# Altium footprint library myPcbLib.PcbLib: 987 footprints (part 52 of 62)
Each footprint in its own frame and in the unit in brackets; x right, y up, seen from the top. Pads: shape width x height; smd on the part's side, far side on the other; paste and mask are expansions set on the pad; w line width, h text height; cw(c..) or ccw(c..) is an arc to the next point about the centre after c.
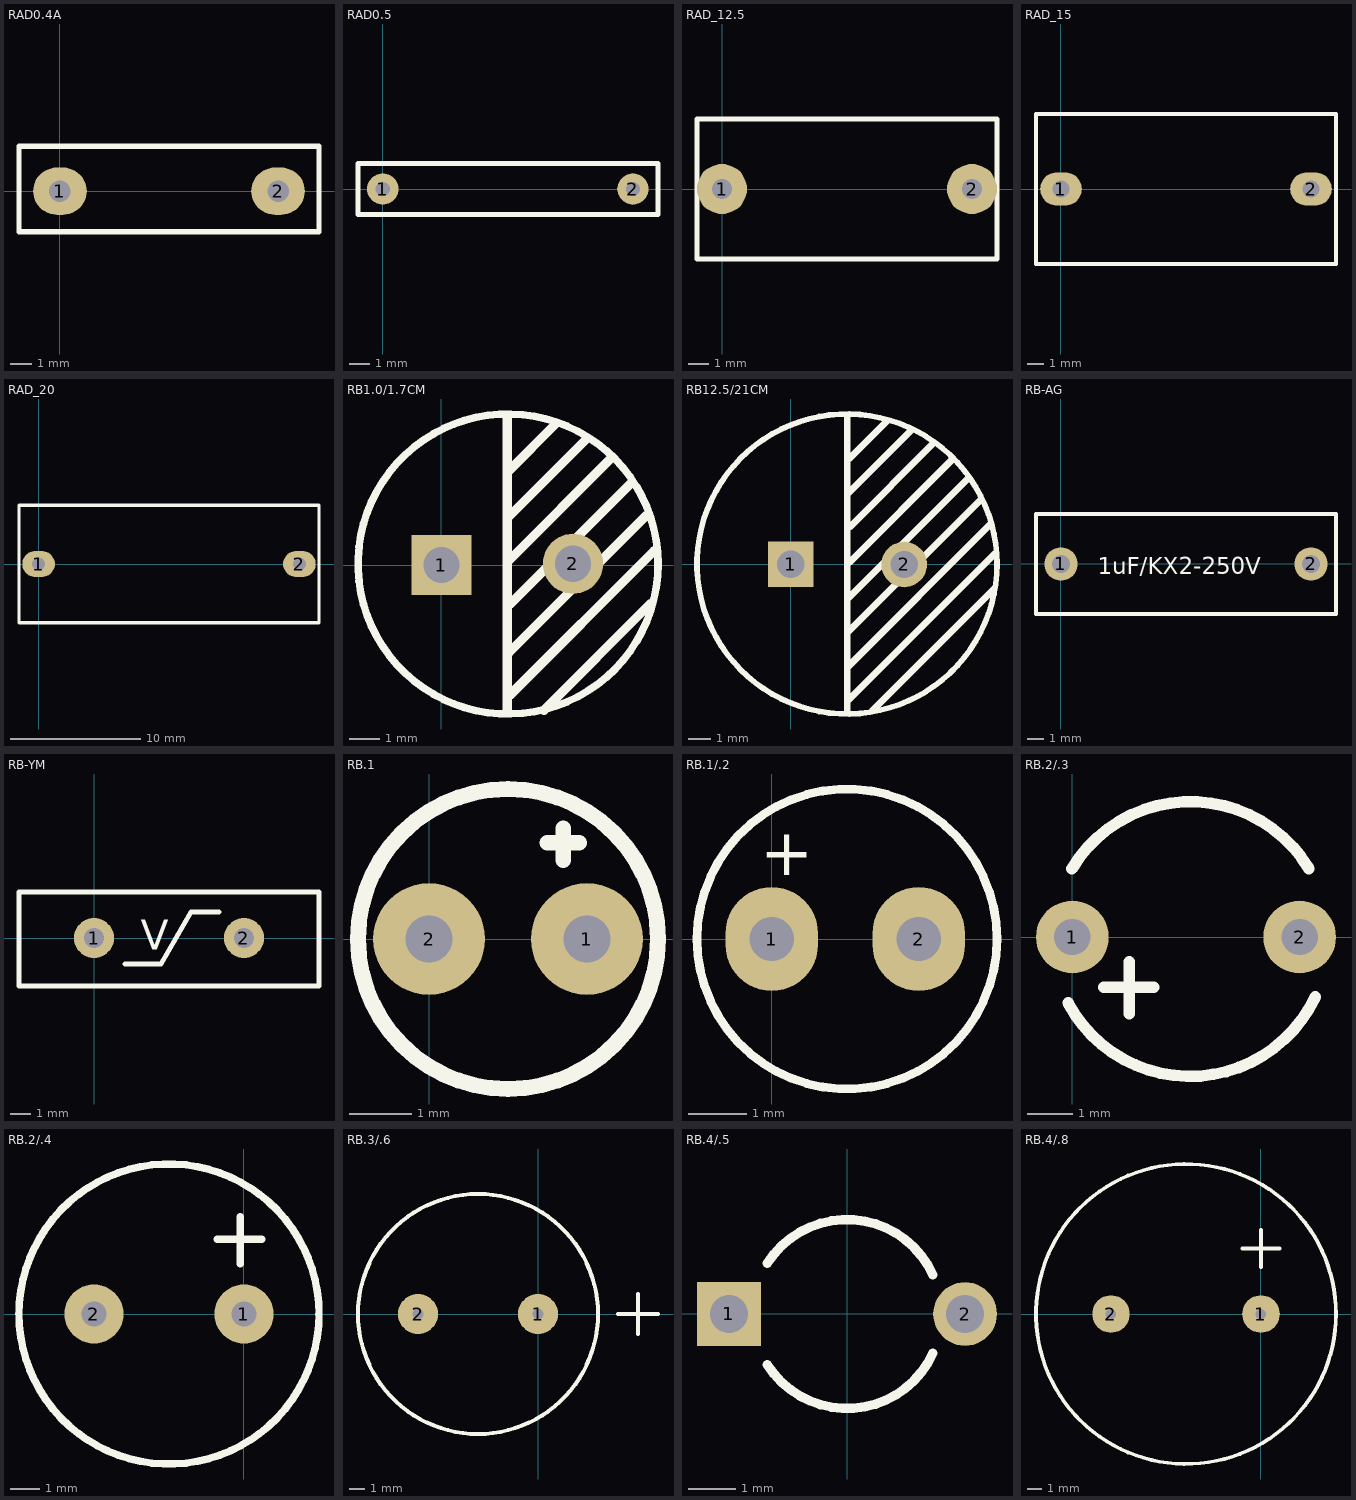
[diagram p51: the footprints below, top view; thin cyan lines are the x and y axes]

## RAD0.4A [mm]
pads (2):
  oval 2.5x2.2 hole 1: 1(0,0) 2(10.16,0)
Top Overlay:
  lines w0.254: -1.905,-1.9 12.065,-1.9 12.065,2.1 -1.905,2.1 -1.905,-1.9

## RAD0.5 [mil]
pads (2):
  round 62 hole 28: 1(0,0) 2(492.13,0)
Top Overlay:
  lines w10: -48.82,-50 541.34,-50 541.34,50 -48.82,50 -48.82,-50

## RAD_12.5 [mm]
pads (2):
  round 2.5 hole 1: 1(0,0) 2(12.5,0)
Top Overlay:
  lines w0.254: -1.25,-3.5 -1.25,3.5 13.75,3.5 13.75,-3.5 -1.25,-3.5

## RAD_15 [mm]
pads (2):
  oval 2.5x2 hole 1: 1(0,0) 2(15,0)
Top Overlay:
  lines w0.254: -1.5,-4.5 16.5,-4.5 16.5,4.5 -1.5,4.5 -1.5,-4.5

## RAD_20 [mm]
pads (2):
  oval 2.5x2 hole 1: 1(0,0) 2(20,0)
Top Overlay:
  lines w0.254: -1.5,-4.5 -1.5,4.5 21.5,4.5 21.5,-4.5 -1.5,-4.5

## RB1.0/1.7CM [mm]
pads (2):
  rect 2x2 hole 1.2: 1(0,0)
  round 2 hole 1.2: 2(4.365,0.04)
Top Overlay:
  circle w0.25: c2.208,0.034 r4.978
  lines w0.305: 2.184,-4.881 2.184,4.972 ; 2.195,1.564 4.841,4.21 ; 2.195,3.088 3.825,4.718 ; 2.216,-2.934 6.788,1.638 ; 2.227,0.146 5.666,3.586 ; 2.258,-4.331 7.063,0.474 ; 2.258,-1.314 6.291,2.718 ; 3.401,-4.818 6.947,-1.272

## RB12.5/21CM [mm]
pads (2):
  rect 2x2 hole 1.2: 1(0,0)
  round 2 hole 1.2: 2(4.974,-0.011)
Top Overlay:
  circle w0.25: c2.466,0.011 r6.579
  lines w0.305: 2.476,-6.519 2.476,6.53 ; 2.498,-4.498 8.731,1.736 ; 2.529,-1.482 7.768,3.757 ; 2.54,-2.953 8.34,2.847 ; 2.551,3.154 5.271,5.874 ; 2.561,-5.937 8.943,0.445 ; 2.572,4.635 4.223,6.286 ; 2.593,0.106 7.048,4.561 ; 2.614,1.662 6.244,5.292 ; 3.588,-6.413 8.922,-1.079

## RB-AG [mm]
pads (2):
  round 2 hole 1.1: 1(0,0) 2(15,0)
Top Overlay:
  lines w0.254: -1.5,-3 -1.5,3 16.5,3 16.5,-3 -1.5,-3
  text "1uF/KX2-250V" at 2.2,-0.6 h1

## RB-YM [mm]
pads (2):
  round 2 hole 1: 1(0,0) 2(7.5,0)
Top Overlay:
  lines w0.254: 1.55,-1.3 3.35,-1.3 4.85,1.3 6.25,1.3 ; -3.75,-2.4 11.25,-2.4 11.25,2.3 -3.75,2.3 -3.75,-2.4
  text "V" at 2.35,-0.6 h1.5

## RB.1 [mm]
pads (2):
  round 1.8 hole 0.762: 1(2.54,0) 2(0,0)
Top Overlay:
  circle w0.254: c1.27,0 r2.413
  lines w0.254: 1.905,1.549 2.413,1.549 ; 2.159,1.27 2.159,1.778

## RB.1/.2 [mm]
pads (2):
  oval 1.6x1.8 hole 0.762: 1(0,0) 2(2.54,0)
Top Overlay:
  circle w0.15: c1.3,0 r2.593
  text "+" at -0.2,1.1 h0.8

## RB.2/.3 [mm]
pads (2):
  round 1.6 hole 0.8: 1(0,0) 2(5,0)
Top Overlay:
  lines w0.254: -0.095,-1.45 ccw(c2.591,-0.025) 5.342,-1.32 ; -0.009,1.505 cw(c2.597,-0.062) 5.204,1.502 ; 0.695,-1.1 1.787,-1.1 ; 1.254,-1.684 1.254,-0.541

## RB.2/.4 [mm]
pads (2):
  round 2 hole 0.85: 1(0,0) 2(-5.08,0)
Top Overlay:
  circle w0.254: c-2.54,0 r5.08
  lines w0.254: -0.9,2.54 0.6,2.54 ; -0.127,1.7 -0.127,3.3

## RB.3/.6 [mil]
pads (2):
  round 100 hole 28: 1(0,0) 2(-300,0)
Top Overlay:
  circle w10: c-150,0 r300
  lines w10: 200,0 300,0 ; 250,-50 250,50

## RB.4/.5 [mm]
height 12
pads (2):
  rect 1.35x1.35 hole 0.8: 1(-2.5,0)
  round 1.35 hole 0.8: 2(2.5,0)
Top Overlay:
  lines w0.2: -1.687,-1.075 ccw(c0,0) 1.819,-0.832 ; -1.687,1.075 cw(c0,0) 1.819,0.832

## RB.4/.8 [mil]
pads (2):
  round 100 hole 28: 1(0,0) 2(-400,0)
Top Overlay:
  circle w10: c-200,0 r400
  lines w10: -50,175 50,175 ; 0,125 0,225